# Altium footprint library разъёмы.PcbLib: 129 footprints (part 3 of 9)
Each footprint in its own frame and in the unit in brackets; x right, y up, seen from the top. Pads: shape width x height; smd on the part's side, far side on the other; paste and mask are expansions set on the pad; w line width, h text height; cw(c..) or ccw(c..) is an arc to the next point about the centre after c.
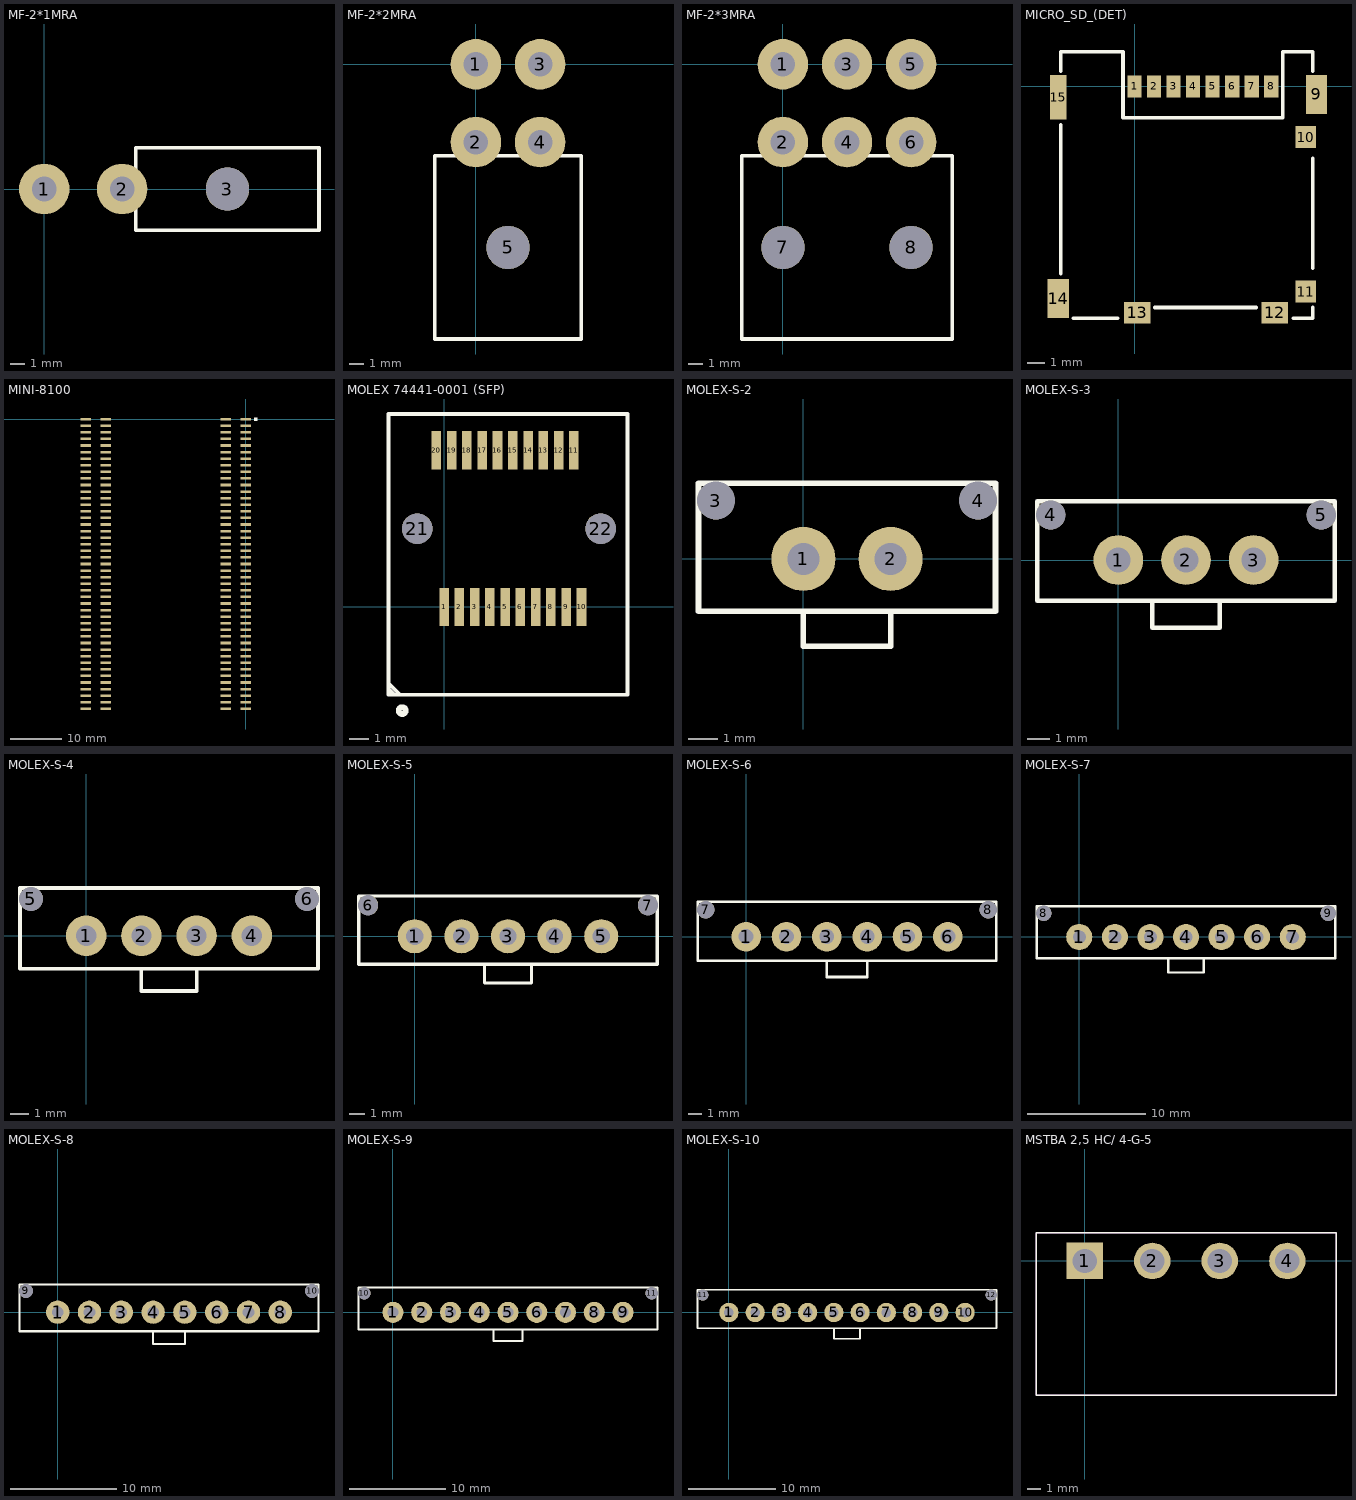
[diagram p2: the footprints below, top view; thin cyan lines are the x and y axes]

## MF-2*1MRA [mm]
pads (3):
  round 3.5 hole 1.7: 1(0,0) 2(5.397,0)
  round 3 hole 3: 3(12.7,0)
Top Overlay:
  lines w0.254: 6.35,-2.857 19.05,-2.857 19.05,2.857 6.35,2.857 6.35,-2.857

## MF-2*2MRA [mm]
pads (5):
  round 3.5 hole 1.7: 1(0,0) 2(0,-5.397) 3(4.445,0) 4(4.445,-5.397)
  round 3 hole 3: 5(2.222,-12.7)
Top Overlay:
  lines w0.254: -2.857,-19.05 7.302,-19.05 7.302,-6.35 -2.857,-6.35 -2.857,-19.05

## MF-2*3MRA [mm]
pads (8):
  round 3.5 hole 1.7: 1(0,0) 2(0,-5.397) 3(4.445,0) 4(4.445,-5.397) 5(8.89,0) 6(8.89,-5.397)
  round 3 hole 3: 7(0,-12.7) 8(8.89,-12.7)
Top Overlay:
  lines w0.254: -2.857,-19.05 11.747,-19.05 11.747,-6.35 -2.857,-6.35 -2.857,-19.05

## MICRO_SD_(DET) [mm]
pads (15):
  rect 0.8x1.25 smd: 1(0,0) 2(1.1,0) 3(2.2,0) 4(3.3,0) 5(4.4,0) 6(5.5,0) 7(6.6,0) 8(7.7,0)
  rect 1.2x2.2 smd: 9(10.25,-0.45) 14(-4.3,-11.95)
  rect 1.16x1.25 smd: 10(9.65,-2.85) 11(9.65,-11.55)
  rect 1.5x1.2 smd: 12(7.9,-12.75) 13(0.15,-12.75)
  rect 0.95x2.5 smd: 15(-4.3,-0.6)
Top Overlay:
  lines w0.2: -4.15,-10.55 -4.15,-2.15 ; -4.15,0.85 -4.15,1.95 -0.65,1.95 -0.65,-1.75 8.35,-1.75 8.35,1.95 10.05,1.95 10.05,0.85 ; -3.45,-13.05 -0.95,-13.05 ; 1.15,-12.45 6.85,-12.45 ; 8.95,-13.05 10.05,-13.05 10.05,-12.45 ; 10.05,-10.25 10.05,-4.05

## MINI-8100 [mm]
pads (180):
  rect 2x0.5 smd: 1(0,0) 2(-3.88,0) 3(0,-1.27) 4(-3.88,-1.27) 5(0,-2.54) 6(-3.88,-2.54) 7(0,-3.81) 8(-3.88,-3.81) 9(0,-5.08) 10(-3.88,-5.08) 11(0,-6.35) 12(-3.88,-6.35) 13(0,-7.62) 14(-3.88,-7.62) 15(0,-8.89) 16(-3.88,-8.89) 17(0,-10.16) 18(-3.88,-10.16) 19(0,-11.43) 20(-3.88,-11.43) 21(0,-12.7) 22(-3.88,-12.7) 23(0,-13.97) 24(-3.88,-13.97) 25(0,-15.24) 26(-3.88,-15.24) 27(0,-16.51) 28(-3.88,-16.51) 29(0,-17.78) 30(-3.88,-17.78) 31(0,-19.05) 32(-3.88,-19.05) 33(0,-20.32) 34(-3.88,-20.32) 35(0,-21.59) 36(-3.88,-21.59) 37(0,-22.86) 38(-3.88,-22.86) 39(0,-24.13) 40(-3.88,-24.13) 41(0,-25.4) 42(-3.88,-25.4) 43(0,-26.67) 44(-3.88,-26.67) 45(0,-27.94) 46(-3.88,-27.94) 47(0,-29.21) 48(-3.88,-29.21) 49(0,-30.48) 50(-3.88,-30.48) 51(0,-31.75) 52(-3.88,-31.75) 53(0,-33.02) 54(-3.88,-33.02) 55(0,-34.29) 56(-3.88,-34.29) 57(0,-35.56) 58(-3.88,-35.56) 59(0,-36.83) 60(-3.88,-36.83) 61(0,-38.1) 62(-3.88,-38.1) 63(0,-39.37) 64(-3.88,-39.37) 65(0,-40.64) 66(-3.88,-40.64) 67(0,-41.91) 68(-3.88,-41.91) 69(0,-43.18) 70(-3.88,-43.18) 71(0,-44.45) 72(-3.88,-44.45) 73(0,-45.72) 74(-3.88,-45.72) 75(0,-46.99) 76(-3.88,-46.99) 77(0,-48.26) 78(-3.88,-48.26) 79(0,-49.53) 80(-3.88,-49.53) 81(0,-50.8) 82(-3.88,-50.8) 83(0,-52.07) 84(-3.88,-52.07) 85(0,-53.34) 86(-3.88,-53.34) 87(0,-54.61) 88(-3.88,-54.61) 89(0,-55.88) 90(-3.88,-55.88) 91(-27,0) 92(-30.88,0) 93(-27,-1.27) 94(-30.88,-1.27) 95(-27,-2.54) 96(-30.88,-2.54) 97(-27,-3.81) 98(-30.88,-3.81) 99(-27,-5.08) 100(-30.88,-5.08) 101(-27,-6.35) 102(-30.88,-6.35) 103(-27,-7.62) 104(-30.88,-7.62) 105(-27,-8.89) 106(-30.88,-8.89) 107(-27,-10.16) 108(-30.88,-10.16) 109(-27,-11.43) 110(-30.88,-11.43) 111(-27,-12.7) 112(-30.88,-12.7) 113(-27,-13.97) 114(-30.88,-13.97) 115(-27,-15.24) 116(-30.88,-15.24) 117(-27,-16.51) 118(-30.88,-16.51) 119(-27,-17.78) 120(-30.88,-17.78) 121(-27,-19.05) 122(-30.88,-19.05) 123(-27,-20.32) 124(-30.88,-20.32) 125(-27,-21.59) 126(-30.88,-21.59) 127(-27,-22.86) 128(-30.88,-22.86) 129(-27,-24.13) 130(-30.88,-24.13) 131(-27,-25.4) 132(-30.88,-25.4) 133(-27,-26.67) 134(-30.88,-26.67) 135(-27,-27.94) 136(-30.88,-27.94) 137(-27,-29.21) 138(-30.88,-29.21) 139(-27,-30.48) 140(-30.88,-30.48) 141(-27,-31.75) 142(-30.88,-31.75) 143(-27,-33.02) 144(-30.88,-33.02) 145(-27,-34.29) 146(-30.88,-34.29) 147(-27,-35.56) 148(-30.88,-35.56) 149(-27,-36.83) 150(-30.88,-36.83) 151(-27,-38.1) 152(-30.88,-38.1) 153(-27,-39.37) 154(-30.88,-39.37) 155(-27,-40.64) 156(-30.88,-40.64) 157(-27,-41.91) 158(-30.88,-41.91) 159(-27,-43.18) 160(-30.88,-43.18) 161(-27,-44.45) 162(-30.88,-44.45) 163(-27,-45.72) 164(-30.88,-45.72) 165(-27,-46.99) 166(-30.88,-46.99) 167(-27,-48.26) 168(-30.88,-48.26) 169(-27,-49.53) 170(-30.88,-49.53) 171(-27,-50.8) 172(-30.88,-50.8) 173(-27,-52.07) 174(-30.88,-52.07) 175(-27,-53.34) 176(-30.88,-53.34) 177(-27,-54.61) 178(-30.88,-54.61) 179(-27,-55.88) 180(-30.88,-55.88)
Top Overlay:
  region: 1.587,-0.318 2.222,-0.318 2.222,0.318 1.587,0.318

## MOLEX 74441-0001 (SFP) [mm]
pads (22):
  rect 0.5x2 smd: 1(0,0) 2(0.8,0) 3(1.6,0) 4(2.4,0) 5(3.2,0) 6(4,0) 7(4.8,0) 8(5.6,0) 9(6.4,0) 10(7.2,0) 11(6.8,8.2) 12(6,8.2) 13(5.2,8.2) 14(4.4,8.2) 15(3.6,8.2) 16(2.8,8.2) 17(2,8.2) 18(1.2,8.2) 19(0.4,8.2) 20(-0.4,8.2)
  round 1.6 hole 1.6 unplated: 21(-1.4,4.1) 22(8.2,4.1)
Top Overlay:
  circle w0.3: c-2.19,-5.43 r0.18
  lines w0.2: -2.9,-4.3 -2.6,-4.6 ; -2.9,-4 -2.3,-4.6 ; -2.9,-4.6 -2.9,10.1 9.6,10.1 9.6,-4.6 -2.9,-4.6

## MOLEX-S-2 [mm]
pads (4):
  round 2.2 hole 1.1: 1(0,0) 2(3,0)
  round 1.3 hole 1.3: 3(-3,2) 4(6,2)
Top Overlay:
  lines w0.2: 0,-1.8 0,-3 3,-3 3,-1.8 ; -3.6,-1.8 -3.6,2.6 6.6,2.6 6.6,-1.8 -3.6,-1.8

## MOLEX-S-3 [mm]
pads (5):
  round 2.2 hole 1.1: 1(0,0) 2(3,0) 3(6,0)
  round 1.3 hole 1.3: 4(-3,2) 5(9,2)
Top Overlay:
  lines w0.2: 1.5,-1.8 1.5,-3 4.5,-3 4.5,-1.8 ; -3.6,-1.8 9.6,-1.8 9.6,2.6 -3.6,2.6 -3.6,-1.8

## MOLEX-S-4 [mm]
pads (6):
  round 2.2 hole 1.1: 1(0,0) 2(3,0) 3(6,0) 4(9,0)
  round 1.3 hole 1.3: 5(-3,2) 6(12,2)
Top Overlay:
  lines w0.2: 3,-1.8 3,-3 6,-3 6,-1.8 ; -3.6,-1.8 12.6,-1.8 12.6,2.6 -3.6,2.6 -3.6,-1.8

## MOLEX-S-5 [mm]
pads (7):
  round 2.2 hole 1.1: 1(0,0) 2(3,0) 3(6,0) 4(9,0) 5(12,0)
  round 1.3 hole 1.3: 6(-3,2) 7(15,2)
Top Overlay:
  lines w0.2: 4.5,-1.8 4.5,-3 7.5,-3 7.5,-1.8 ; -3.6,-1.8 15.6,-1.8 15.6,2.6 -3.6,2.6 -3.6,-1.8

## MOLEX-S-6 [mm]
pads (8):
  round 2.2 hole 1.1: 1(0,0) 2(3,0) 3(6,0) 4(9,0) 5(12,0) 6(15,0)
  round 1.3 hole 1.3: 7(-3,2) 8(18,2)
Top Overlay:
  lines w0.2: 6,-1.8 6,-3 9,-3 9,-1.8 ; -3.6,-1.8 18.6,-1.8 18.6,2.6 -3.6,2.6 -3.6,-1.8

## MOLEX-S-7 [mm]
pads (9):
  round 2.2 hole 1.1: 1(0,0) 2(3,0) 3(6,0) 4(9,0) 5(12,0) 6(15,0) 7(18,0)
  round 1.3 hole 1.3: 8(-3,2) 9(21,2)
Top Overlay:
  lines w0.2: 7.5,-1.8 7.5,-3 10.5,-3 10.5,-1.8 ; -3.6,-1.8 21.6,-1.8 21.6,2.6 -3.6,2.6 -3.6,-1.8

## MOLEX-S-8 [mm]
pads (10):
  round 2.2 hole 1.1: 1(0,0) 2(3,0) 3(6,0) 4(9,0) 5(12,0) 6(15,0) 7(18,0) 8(21,0)
  round 1.3 hole 1.3: 9(-3,2) 10(24,2)
Top Overlay:
  lines w0.2: 9,-1.8 9,-3 12,-3 12,-1.8 ; -3.6,-1.8 24.6,-1.8 24.6,2.6 -3.6,2.6 -3.6,-1.8

## MOLEX-S-9 [mm]
pads (11):
  round 2.2 hole 1.1: 1(0,0) 2(3,0) 3(6,0) 4(9,0) 5(12,0) 6(15,0) 7(18,0) 8(21,0) 9(24,0)
  round 1.3 hole 1.3: 10(-3,2) 11(27,2)
Top Overlay:
  lines w0.2: 10.5,-1.8 10.5,-3 13.5,-3 13.5,-1.8 ; -3.6,-1.8 27.6,-1.8 27.6,2.6 -3.6,2.6 -3.6,-1.8

## MOLEX-S-10 [mm]
pads (12):
  round 2.2 hole 1.1: 1(0,0) 2(3,0) 3(6,0) 4(9,0) 5(12,0) 6(15,0) 7(18,0) 8(21,0) 9(24,0) 10(27,0)
  round 1.3 hole 1.3: 11(-3,2) 12(30,2)
Top Overlay:
  lines w0.2: 12,-1.8 12,-3 15,-3 15,-1.8 ; -3.6,-1.8 30.6,-1.8 30.6,2.6 -3.6,2.6 -3.6,-1.8

## MSTBA 2,5 HC/ 4-G-5 [mm]
pads (4):
  rect 2.7x2.7 hole 1.8: 1(0,0)
  round 2.7 hole 1.8: 2(5,0) 3(10,0) 4(15,0)
Top Overlay:
  lines w0.1: -3.6,-9.925 -3.6,2.075 18.6,2.075 18.6,-9.925 -3.6,-9.925
Mechanical 13:
  lines w0.1: -3.6,-9.925 18.6,-9.925 18.6,2.075 -3.6,2.075 -3.6,-9.925
  text ".Designator" at 7.75,-4.975 h1.5
3D body "1923775.stp": height 8.6, standoff -3.5, extent -3.5,-10 18.5,2